# Altium footprint library SparkFun-Retired.PCBLIB: 303 footprints (part 1 of 19)
Each footprint in its own frame and in the unit in brackets; x right, y up, seen from the top. Pads: shape width x height; smd on the part's side, far side on the other; paste and mask are expansions set on the pad; w line width, h text height; cw(c..) or ccw(c..) is an arc to the next point about the centre after c.
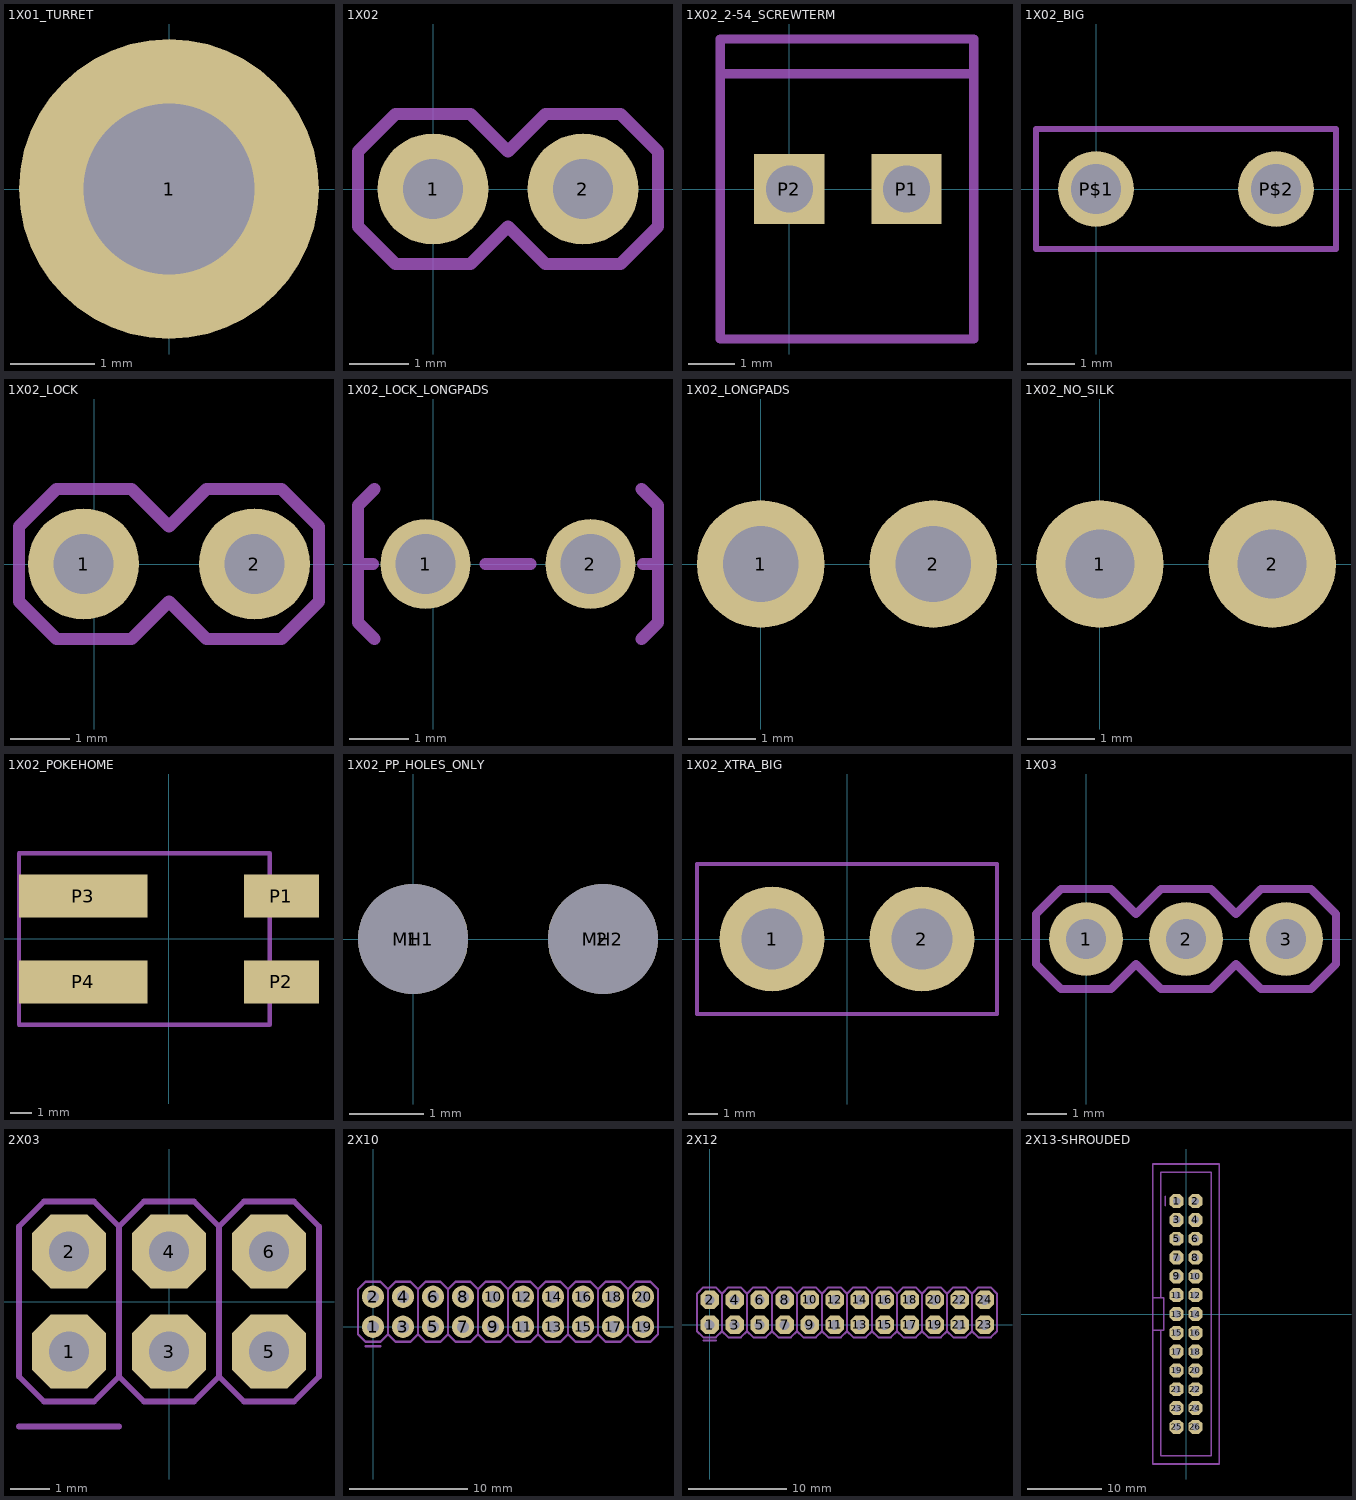
[diagram p0: the footprints below, top view; thin cyan lines are the x and y axes]

## 1X01_TURRET [mil]
pads (1):
  round 140 hole 80: 1(0,0)
tDocu:
  circle w5: c0,0 r65.76

## 1X02 [mil]
pads (2):
  round 74 hole 40: 1(0,0) 2(100,0)
tDocu:
  region: 90,-10 90,10 110,10 110,-10
  region: -10,-10 -10,10 10,10 10,-10
tPlace:
  lines w8: -50,-25 -50,25 -25,50 25,50 50,25 75,50 125,50 150,25 150,-25 125,-50 75,-50 50,-25 25,-50 -25,-50 -50,-25

## 1X02_2-54_SCREWTERM [mil]
pads (2):
  rect 60x60 / inner round 55.43 / far side rect 60x60 hole 40: P1(100,0) P2(0,0)
tPlace:
  lines w8: -59.06,98.43 -59.06,-127.95 157.48,-127.95 157.48,98.43 ; -59.06,98.43 -59.06,127.95 157.48,127.95 157.48,98.43 ; -59.06,98.43 157.48,98.43

## 1X02_BIG [mil]
pads (2):
  round 63 hole 42: P$1(0,0) P$2(150,0)
tPlace:
  lines w5: -50,-50 -50,50 200,50 200,-50 -50,-50

## 1X02_LOCK [mil]
pads (2):
  round 74 hole 40: 1(-7,0) 2(107,0)
tDocu:
  region: -11.5,-11.5 -11.5,11.5 11.5,11.5 11.5,-11.5
  region: 88.5,-11.5 88.5,11.5 111.5,11.5 111.5,-11.5
tPlace:
  lines w8: -50,-25 -50,25 -25,50 25,50 50,25 75,50 125,50 150,25 150,-25 125,-50 75,-50 50,-25 25,-50 -25,-50 -50,-25

## 1X02_LOCK_LONGPADS [mil]
pads (2):
  round 60 hole 40: 1(-5,0) 2(105,0)
tDocu:
  region: -11.5,-11.5 -11.5,11.5 11.5,11.5 11.5,-11.5
  region: 88.5,-11.5 88.5,11.5 111.5,11.5 111.5,-11.5
tPlace:
  lines w8: -40,0 -50,0 ; -39,-50 -50,-39 -50,0 ; -39,50 -50,39 -50,0 ; 35,0 65,0 ; 139,-50 150,-39 150,0 ; 139,50 150,39 150,0 ; 140,0 150,0

## 1X02_LONGPADS [mil]
pads (2):
  round 74 hole 44: 1(0,0) 2(100,0)

## 1X02_NO_SILK [mil]
pads (2):
  round 74 hole 40: 1(0,0) 2(100,0)
tDocu:
  region: 90,-10 90,10 110,10 110,-10
  region: -10,-10 -10,10 10,10 10,-10

## 1X02_POKEHOME [mm]
pads (4):
  rect 3.5x2 smd: P1(5.25,2) P2(5.25,-2)
  rect 6x2 smd: P3(-4,2) P4(-4,-2)
tPlace:
  lines w0.203: -7,-4 -7,2 -7,4 4.7,4 4.7,-4 -7,-4

## 1X02_PP_HOLES_ONLY [mil]
pads (4):
  round 35 hole 35: 1(0,0) 2(100,0)
  round 58 hole 58 unplated: MH1(0,0) MH2(100,0)
tDocu:
  circle w5: c0,0 r25
  circle w5: c100,0 r25

## 1X02_XTRA_BIG [mil]
pads (2):
  round 140 hole 81: 1(-100,0) 2(100,0)
tPlace:
  lines w5: -200,-100 -200,100 200,100 200,-100 -200,-100

## 1X03 [mil]
pads (3):
  round 74 hole 40: 1(0,0) 2(100,0) 3(200,0)
tDocu:
  region: 190,-10 190,10 210,10 210,-10
  region: 90,-10 90,10 110,10 110,-10
  region: -10,-10 -10,10 10,10 10,-10
tPlace:
  lines w8: -50,-25 -50,25 -25,50 25,50 50,25 75,50 125,50 150,25 175,50 225,50 250,25 250,-25 225,-50 175,-50 150,-25 125,-50 75,-50 50,-25 25,-50 -25,-50 -50,-25

## 2X03 [mil]
pads (6):
  oct 74x74 / inner round 68.37 / far side oct 74x74 hole 40: 1(-100,-50) 2(-100,50) 3(0,-50) 4(0,50) 5(100,-50) 6(100,50)
tDocu:
  region: -110,-60 -110,-40 -90,-40 -90,-60
  region: -110,40 -110,60 -90,60 -90,40
  region: -10,40 -10,60 10,60 10,40
  region: -10,-60 -10,-40 10,-40 10,-60
  region: 90,40 90,60 110,60 110,40
  region: 90,-60 90,-40 110,-40 110,-60
tPlace:
  lines w6: -150,-125 -50,-125 ; -50,-75 -75,-100 -125,-100 -150,-75 -150,75 -125,100 -75,100 -50,75 ; -50,-75 -25,-100 25,-100 50,-75 ; -50,-75 -50,75 ; -50,75 -25,100 25,100 50,75 ; 50,-75 50,75 ; 50,-75 75,-100 125,-100 150,-75 150,75 125,100 75,100 50,75

## 2X10 [mil]
pads (20):
  round 74 hole 40: 1(0,0) 2(0,100) 3(100,0) 4(100,100) 5(200,0) 6(200,100) 7(300,0) 8(300,100) 9(400,0) 10(400,100) 11(500,0) 12(500,100) 13(600,0) 14(600,100) 15(700,0) 16(700,100) 17(800,0) 18(800,100) 19(900,0) 20(900,100)
tDocu:
  region: -10,-10 -10,10 10,10 10,-10
  region: -10,90 -10,110 10,110 10,90
  region: 90,90 90,110 110,110 110,90
  region: 90,-10 90,10 110,10 110,-10
  region: 190,90 190,110 210,110 210,90
  region: 190,-10 190,10 210,10 210,-10
  region: 290,90 290,110 310,110 310,90
  region: 390,90 390,110 410,110 410,90
  region: 490,90 490,110 510,110 510,90
  region: 290,-10 290,10 310,10 310,-10
  region: 390,-10 390,10 410,10 410,-10
  region: 490,-10 490,10 510,10 510,-10
  region: 590,90 590,110 610,110 610,90
  region: 590,-10 590,10 610,10 610,-10
  region: 690,90 690,110 710,110 710,90
  region: 690,-10 690,10 710,10 710,-10
  region: 790,90 790,110 810,110 810,90
  region: 790,-10 790,10 810,10 810,-10
  region: 890,90 890,110 910,110 910,90
  region: 890,-10 890,10 910,10 910,-10
tPlace:
  lines w8: -25,-65 25,-65 ; 50,-25 25,-50 -25,-50 -50,-25 -50,125 -25,150 25,150 50,125 ; 50,-25 75,-50 125,-50 150,-25 ; 50,-25 50,125 ; 50,125 75,150 125,150 150,125 ; 150,-25 175,-50 225,-50 250,-25 ; 150,-25 150,125 ; 150,125 175,150 225,150 250,125 ; 250,-25 275,-50 325,-50 350,-25 ; 250,-25 250,125 ; 250,125 275,150 325,150 350,125 ; 350,-25 375,-50 425,-50 450,-25 ; 350,-25 350,125 ; 350,125 375,150 425,150 450,125 ; 450,-25 475,-50 525,-50 550,-25 ; 450,-25 450,125 ; 450,125 475,150 525,150 550,125 ; 550,-25 575,-50 625,-50 650,-25 ; 550,-25 550,125 ; 550,125 575,150 625,150 650,125 ; 650,-25 675,-50 725,-50 750,-25 ; 650,-25 650,125 ; 650,125 675,150 725,150 750,125 ; 750,-25 775,-50 825,-50 850,-25 ; 750,-25 750,125 ; 750,125 775,150 825,150 850,125 ; 850,-25 850,125 ; 850,-25 875,-50 925,-50 950,-25 950,125 925,150 875,150 850,125
bPlace:
  lines w8: -25,-65 25,-65

## 2X12 [mil]
pads (24):
  oct 74x74 / inner round 68.37 / far side oct 74x74 hole 40: 1(0,0) 2(0,100) 3(100,0) 4(100,100) 5(200,0) 6(200,100) 7(300,0) 8(300,100) 9(400,0) 10(400,100) 11(500,0) 12(500,100) 13(600,0) 14(600,100) 15(700,0) 16(700,100) 17(800,0) 18(800,100) 19(900,0) 20(900,100) 21(1000,0) 22(1000,100) 23(1100,0) 24(1100,100)
tDocu:
  region: -10,-10 -10,10 10,10 10,-10
  region: -10,90 -10,110 10,110 10,90
  region: 90,90 90,110 110,110 110,90
  region: 90,-10 90,10 110,10 110,-10
  region: 190,90 190,110 210,110 210,90
  region: 190,-10 190,10 210,10 210,-10
  region: 290,-10 290,10 310,10 310,-10
  region: 290,90 290,110 310,110 310,90
  region: 390,90 390,110 410,110 410,90
  region: 390,-10 390,10 410,10 410,-10
  region: 490,90 490,110 510,110 510,90
  region: 490,-10 490,10 510,10 510,-10
  region: 590,-10 590,10 610,10 610,-10
  region: 590,90 590,110 610,110 610,90
  region: 690,90 690,110 710,110 710,90
  region: 690,-10 690,10 710,10 710,-10
  region: 790,90 790,110 810,110 810,90
  region: 790,-10 790,10 810,10 810,-10
  region: 890,-10 890,10 910,10 910,-10
  region: 890,90 890,110 910,110 910,90
  region: 990,90 990,110 1010,110 1010,90
  region: 990,-10 990,10 1010,10 1010,-10
  region: 1090,90 1090,110 1110,110 1110,90
  region: 1090,-10 1090,10 1110,10 1110,-10
tPlace:
  lines w8: -25,-63.19 25,-63.19 ; 50,-25 25,-50 -25,-50 -50,-25 -50,125 -25,150 25,150 50,125 ; 50,-25 75,-50 125,-50 150,-25 ; 50,-25 50,125 ; 50,125 75,150 125,150 150,125 ; 150,-25 175,-50 225,-50 250,-25 ; 150,-25 150,125 ; 150,125 175,150 225,150 250,125 ; 250,-25 275,-50 325,-50 350,-25 ; 250,-25 250,125 ; 250,125 275,150 325,150 350,125 ; 350,-25 375,-50 425,-50 450,-25 ; 350,-25 350,125 ; 350,125 375,150 425,150 450,125 ; 450,-25 475,-50 525,-50 550,-25 ; 450,-25 450,125 ; 450,125 475,150 525,150 550,125 ; 550,-25 575,-50 625,-50 650,-25 ; 550,-25 550,125 ; 550,125 575,150 625,150 650,125 ; 650,-25 675,-50 725,-50 750,-25 ; 650,-25 650,125 ; 650,125 675,150 725,150 750,125 ; 750,-25 775,-50 825,-50 850,-25 ; 750,-25 750,125 ; 750,125 775,150 825,150 850,125 ; 850,-25 875,-50 925,-50 950,-25 ; 850,-25 850,125 ; 850,125 875,150 925,150 950,125 ; 950,-25 975,-50 1025,-50 1050,-25 ; 950,-25 950,125 ; 950,125 975,150 1025,150 1050,125 ; 1050,-25 1075,-50 1125,-50 1150,-25 1150,125 1125,150 1075,150 1050,125 ; 1050,-25 1050,125

## 2X13-SHROUDED [mil]
pads (26):
  oct 74x74 / inner round 68.37 / far side oct 74x74 hole 40: 1(-50,600) 2(50,600) 3(-50,500) 4(50,500) 5(-50,400) 6(50,400) 7(-50,300) 8(50,300) 9(-50,200) 10(50,200) 11(-50,100) 12(50,100) 13(-50,0) 14(50,0) 15(-50,-100) 16(50,-100) 17(-50,-200) 18(50,-200) 19(-50,-300) 20(50,-300) 21(-50,-400) 22(50,-400) 23(-50,-500) 24(50,-500) 25(-50,-600) 26(50,-600)
tDocu:
  region: -60,590 -60,610 -40,610 -40,590
  region: 40,590 40,610 60,610 60,590
  region: 40,490 40,510 60,510 60,490
  region: -60,490 -60,510 -40,510 -40,490
  region: 40,390 40,410 60,410 60,390
  region: -60,390 -60,410 -40,410 -40,390
  region: 40,290 40,310 60,310 60,290
  region: -60,290 -60,310 -40,310 -40,290
  region: 40,190 40,210 60,210 60,190
  region: -60,190 -60,210 -40,210 -40,190
  region: -60,290 -60,310 -40,310 -40,290
  region: 40,290 40,310 60,310 60,290
  region: -60,90 -60,110 -40,110 -40,90
  region: 40,90 40,110 60,110 60,90
  region: 40,-10 40,10 60,10 60,-10
  region: -60,-10 -60,10 -40,10 -40,-10
  region: 40,-110 40,-90 60,-90 60,-110
  region: -60,-110 -60,-90 -40,-90 -40,-110
  region: 40,-210 40,-190 60,-190 60,-210
  region: -60,-210 -60,-190 -40,-190 -40,-210
  region: 40,-310 40,-290 60,-290 60,-310
  region: -60,-310 -60,-290 -40,-290 -40,-310
  region: -60,-210 -60,-190 -40,-190 -40,-210
  region: 40,-210 40,-190 60,-190 60,-210
  region: 40,-410 40,-390 60,-390 60,-410
  region: -60,-410 -60,-390 -40,-390 -40,-410
  region: 40,-510 40,-490 60,-490 60,-510
  region: -60,-510 -60,-490 -40,-490 -40,-510
  region: 40,-610 40,-590 60,-590 60,-610
  region: -60,-610 -60,-590 -40,-590 -40,-610
  region: -60,-510 -60,-490 -40,-490 -40,-510
  region: 40,-510 40,-490 60,-490 60,-510
  lines w8: -133.86,-86.61 -133.86,-754.33 133.86,-754.33 133.86,754.33 -133.86,754.33 -133.86,86.61
tPlace:
  lines w8: -109.25,575 -109.25,625 ; 173.23,797.64 -177.17,797.64 -177.17,86.61 ; 177.17,797.64 177.17,-797.64 -177.17,-797.64 -177.17,-86.61 ; -177.17,-86.61 -177.17,86.61 ; -177.17,-86.61 -118.11,-86.61 -118.11,86.61 -177.17,86.61